# Altium footprint library NDLib.PCBLIB: 499 footprints (part 23 of 32)
Each footprint in its own frame and in the unit in brackets; x right, y up, seen from the top. Pads: shape width x height; smd on the part's side, far side on the other; paste and mask are expansions set on the pad; w line width, h text height; cw(c..) or ccw(c..) is an arc to the next point about the centre after c.
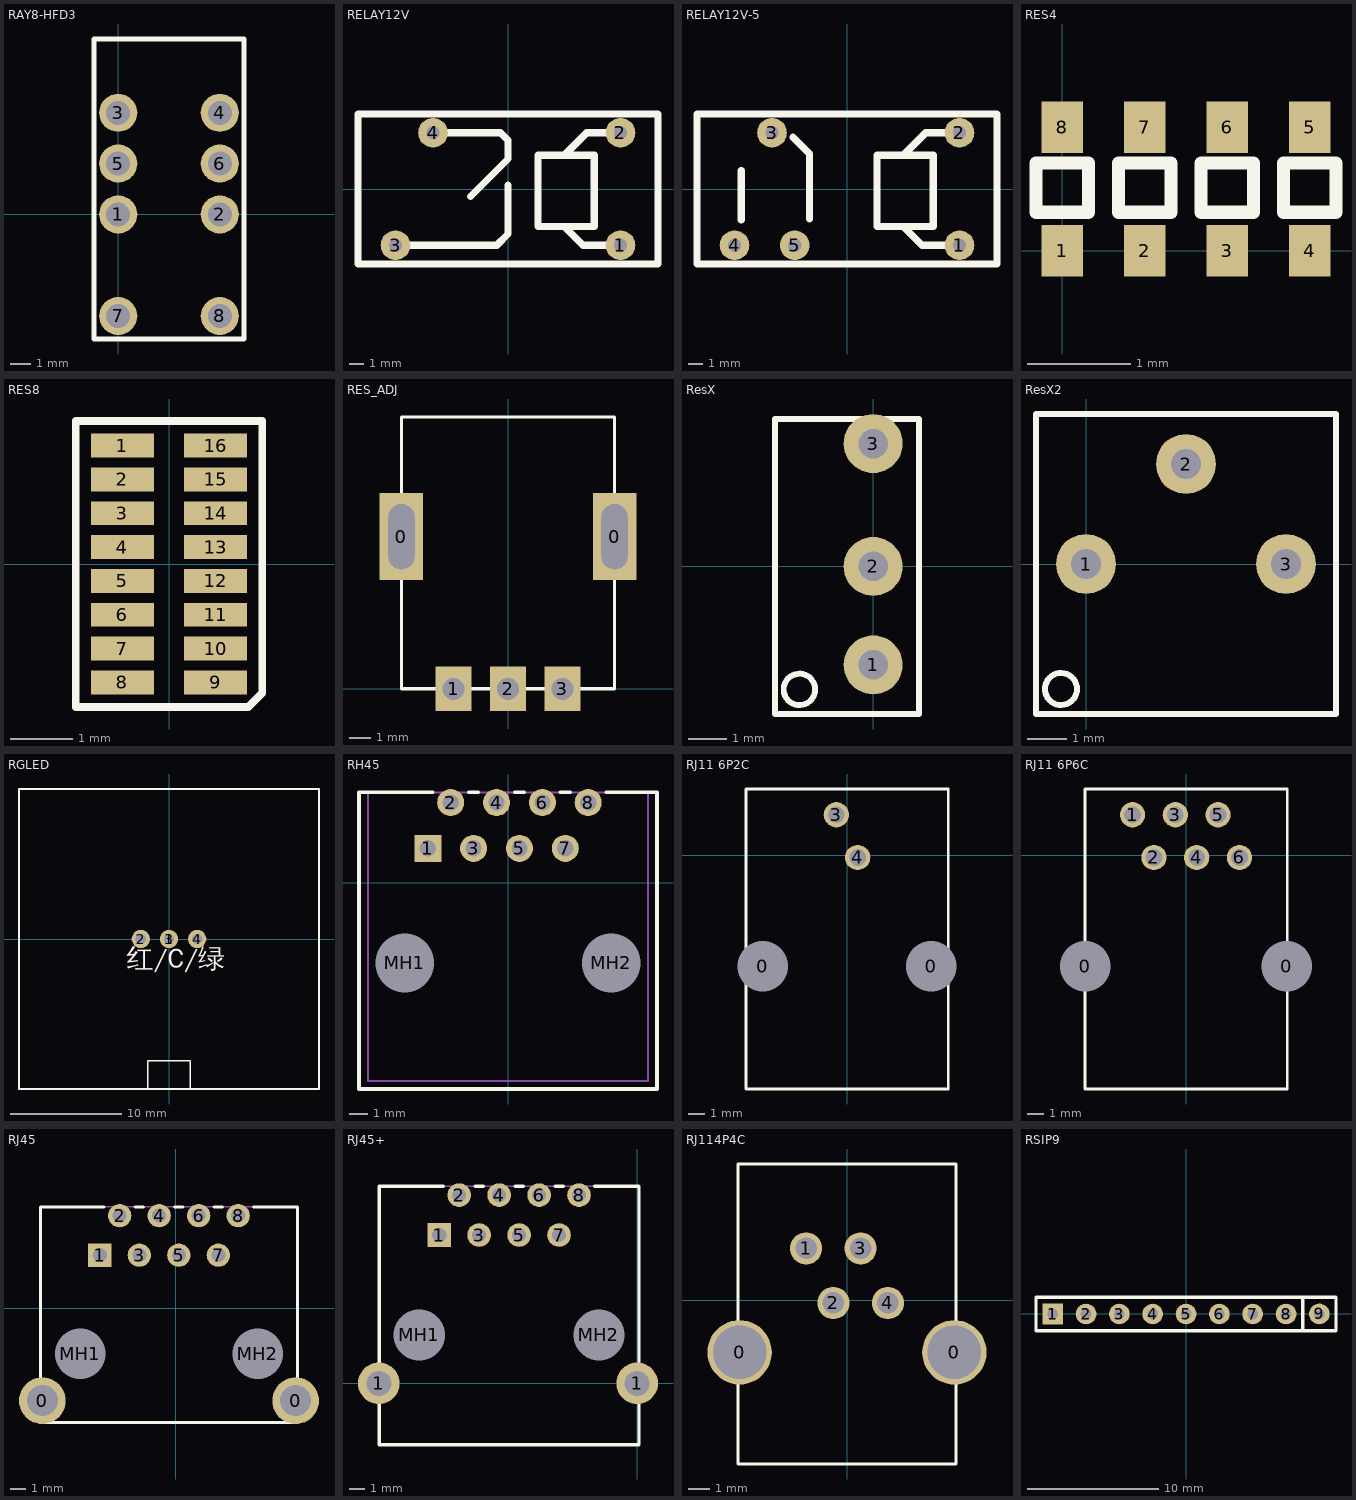
[diagram p22: the footprints below, top view; thin cyan lines are the x and y axes]

## RAY8-HFD3 [mm]
pads (8):
  round 1.905 hole 1.2: 1(0,0) 2(5.08,0) 3(0,5.08) 4(5.08,5.08) 5(0,2.54) 6(5.08,2.54) 7(0,-5.08) 8(5.08,-5.08)
TopOverlay:
  lines w0.254: -1.21,-6.23 -1.21,8.77 6.29,8.77 6.29,-6.23 -1.21,-6.23

## RELAY12V [mm]
pads (4):
  round 2 hole 0.9: 1(7.62,-3.81) 2(7.62,3.81) 3(-7.62,-3.81) 4(-5.08,3.81)
TopOverlay:
  lines w0.5: -7.62,-3.81 -2.54,-3.81 -0.762,-3.81 0,-3.048 0,0.254 ; -5.08,3.81 -1.27,3.81 -0.508,3.81 0,3.302 0,2.032 -2.54,-0.508 ; 2.032,0.762 2.032,2.286 5.842,2.286 5.842,-2.54 2.032,-2.54 2.032,2.032 ; 3.81,-2.54 5.08,-3.81 7.62,-3.81 ; 3.81,2.286 5.334,3.81 7.62,3.81 ; -10.16,-5.08 -10.16,5.08 10.16,5.08 10.16,-5.08 -10.16,-5.08

## RELAY12V-5 [mm]
pads (5):
  round 2 hole 0.9: 1(7.62,-3.81) 2(7.62,3.81) 3(-5.08,3.81) 4(-7.62,-3.81) 5(-3.54,-3.81)
TopOverlay:
  lines w0.5: -7.171,-2.076 -7.171,1.226 ; -3.661,3.504 -2.54,2.383 -2.54,-2.032 ; 2.032,0.762 2.032,2.286 5.842,2.286 5.842,-2.54 2.032,-2.54 2.032,2.032 ; 3.81,-2.54 5.08,-3.81 7.62,-3.81 ; 3.81,2.286 5.334,3.81 7.62,3.81 ; -10.16,-5.08 10.16,-5.08 10.16,5.08 -10.16,5.08 -10.16,-5.08

## RES4 [mm]
pads (8):
  rect 0.4x0.5 smd: 1(0,0) 2(0.8,0) 3(1.6,0) 4(2.4,0) 5(2.4,1.2) 6(1.6,1.2) 7(0.8,1.2) 8(0,1.2)
TopOverlay:
  lines w0.127: -0.255,0.375 -0.255,0.853 0.254,0.853 0.254,0.375 -0.255,0.375 ; 0.545,0.375 1.054,0.375 1.054,0.853 0.545,0.853 0.545,0.375 ; 1.345,0.375 1.854,0.375 1.854,0.853 1.345,0.853 1.345,0.375 ; 2.145,0.375 2.654,0.375 2.654,0.853 2.145,0.853 2.145,0.375

## RES8 [mil]
pads (16):
  rect 40x15 smd: 1(-29.53,75) 2(-29.53,53.57) 3(-29.53,32.14) 4(-29.53,10.71) 5(-29.53,-10.72) 6(-29.53,-32.14) 7(-29.53,-53.57) 8(-29.53,-75) 9(29.53,-75) 10(29.53,-53.57) 11(29.53,-32.14) 12(29.53,-10.71) 13(29.53,10.72) 14(29.53,32.14) 15(29.53,53.57) 16(29.53,75)
TopOverlay:
  lines w5: -59.06,-90.55 50.2,-90.55 59.06,-81.69 59.06,90.55 -59.06,90.55 -59.06,-90.55

## RES_ADJ [mm]
height 0.381
pads (5):
  rect 2x4 hole 1.2 slot 3 at 90 deg: 0(-4.9,7) 0(4.9,7)
  rect 1.651x2.032 hole 1.016: 1(-2.5,0) 2(0,0) 3(2.5,0)
TopOverlay:
  lines w0.152: -4.9,0 4.9,0 4.9,12.5 -4.9,12.5 -4.9,0

## ResX [mil]
pads (3):
  round 60 hole 30: 1(0,-100) 2(0,0) 3(0,125)
TopOverlay:
  circle w6: c-75,-125 r16
  lines w6: 46.73,-150 0,-150 -100,-150 -100,150 0,150 46.73,150 46.73,-149.31

## ResX2 [mil]
pads (3):
  round 60 hole 30: 1(0,0) 2(100,100) 3(200,0)
TopOverlay:
  circle w6: c-25,-125 r16
  lines w6: -50,-150 -50,150 50,150 250,150 250,-150 50,-150 -50,-150

## RGLED [mil]
height 150
pads (4):
  round 65 hole 36: 1(0,0) 2(-100,0) 3(0,0) 4(100,0)
TopOverlay:
  lines w6: -75,-531.5 -75,-431.5 0,-431.5 75,-431.5 75,-531.5 ; -531.5,-531.5 531.5,-531.5 531.5,531.5 -531.5,531.5 -531.5,-531.5
  text "红/C/绿" at -150,-125 h120

## RH45 [mm] "NetBar;Enlarged"
pads (10):
  rect 1.5x1.5 hole 0.9: 1(-4.445,1.905)
  round 1.5 hole 0.9: 2(-3.175,4.445) 3(-1.905,1.905) 4(-0.635,4.445) 5(0.635,1.905) 6(1.905,4.445) 7(3.175,1.905) 8(4.445,4.445)
  round 2.95 hole 3.25 unplated: MH1(-5.715,-4.445) MH2(5.715,-4.445)
TopOverlay:
  lines w0.2: -4.179,5.005 -8.255,5.005 -8.255,-11.43 8.255,-11.43 8.255,5.005 5.449,5.005 ; -2.171,5.005 -1.639,5.005 ; 0.369,5.005 0.901,5.005 ; 2.909,5.005 3.441,5.005
Mechanical13:
  lines w0.1: -7.75,-10.995 7.75,-10.995 7.75,5.005 -7.75,5.005 -7.75,-10.995
3D body: height 16.38, standoff 0, extent -7.75,-10.995 7.75,5.005

## RJ11 6P2C [mm]
height 15
pads (4):
  round 2.2 hole 3 unplated: 0(-5,-6.58) 0(5,-6.58)
  round 1.5 hole 1: 3(-0.635,2.42) 4(0.635,-0.12)
TopOverlay:
  lines w0.152: -6,-13.875 6.025,-13.875 6.025,3.95 -6,3.95 -6,-13.875
BottomOverlay:
  region: 2.794,2.794 0.508,2.794 0.508,2.032 2.794,2.032
  region: 3.429,-1.016 3.429,1.016 2.667,1.016 2.667,-1.016
  region: 4.191,0.381 1.905,0.381 1.905,-0.381 4.191,-0.381

## RJ11 6P6C [mm]
height 15
pads (8):
  round 2.2 hole 3 unplated: 0(-6,-6.58) 0(6,-6.58)
  round 1.5 hole 1: 1(-3.175,2.42) 2(-1.905,-0.12) 3(-0.635,2.42) 4(0.635,-0.12) 5(1.905,2.42) 6(3.175,-0.12)
TopOverlay:
  lines w0.152: -6,-13.875 6.025,-13.875 6.025,3.95 -6,3.95 -6,-13.875

## RJ45 [mm]
pads (12):
  round 3 hole 2: 0(-8.586,-5.948) 0(7.7,-5.948)
  rect 1.5x1.5 hole 0.9: 1(-4.888,3.408)
  round 1.5 hole 0.9: 2(-3.618,5.948) 3(-2.348,3.408) 4(-1.078,5.948) 5(0.192,3.408) 6(1.462,5.948) 7(2.732,3.408) 8(4.002,5.948)
  round 2.95 hole 3.25 unplated: MH1(-6.158,-2.942) MH2(5.272,-2.942)
TopOverlay:
  lines w0.2: -4.622,6.508 -8.698,6.508 -8.698,-7.348 7.812,-7.348 7.812,6.508 5.006,6.508 ; -2.614,6.508 -2.082,6.508 ; -0.074,6.508 0.458,6.508 ; 2.466,6.508 2.998,6.508
Mechanical13:
  lines w0.1: -8.193,6.508 7.307,6.508

## RJ45+ [mm]
pads (12):
  round 2.65 hole 1.6: 1(-16.425,0) 1(0,0)
  rect 1.5x1.5 hole 0.9: 1(-12.588,9.431)
  round 1.5 hole 0.9: 2(-11.318,11.971) 3(-10.048,9.431) 4(-8.778,11.971) 5(-7.508,9.431) 6(-6.238,11.971) 7(-4.968,9.431) 8(-3.698,11.971)
  round 2.95 hole 3.25 unplated: MH1(-13.858,3.081) MH2(-2.428,3.081)
TopOverlay:
  lines w0.2: -12.322,12.531 -16.398,12.531 -16.398,-3.904 0.112,-3.904 0.112,12.531 -2.694,12.531 ; -10.314,12.531 -9.782,12.531 ; -7.774,12.531 -7.242,12.531 ; -5.234,12.531 -4.702,12.531
Mechanical13:
  lines w0.1: -15.893,12.531 -0.393,12.531

## RJ114P4C [mm]
height 15
pads (6):
  round 3 hole 2.5 unplated: 0(-5,-2.42) 0(5,-2.42)
  round 1.5 hole 1: 1(-1.905,2.42) 2(-0.635,-0.12) 3(0.635,2.42) 4(1.905,-0.12)
TopOverlay:
  lines w0.152: -5.08,-7.62 -5.08,6.35 5.08,6.35 5.08,-7.62 -5.08,-7.62

## RSIP9 [mil]
height 100
pads (9):
  rect 62x62 hole 32: 1(-399.98,-0.06)
  round 62 hole 32: 2(-299.98,-0.06) 3(-199.98,-0.06) 4(-99.98,-0.06) 5(0.02,-0.06) 6(100.02,-0.06) 7(200.02,-0.06) 8(300.02,-0.06) 9(399.98,0.06)
TopOverlay:
  lines w10: 349.98,-50.06 349.98,49.94 ; -450.02,-50.06 -450.02,49.94 449.98,49.94 449.98,-50.06 -450.02,-50.06